# Altium footprint library PCB.PcbLib: 42 footprints (part 1 of 3)
Each footprint in its own frame and in the unit in brackets; x right, y up, seen from the top. Pads: shape width x height; smd on the part's side, far side on the other; paste and mask are expansions set on the pad; w line width, h text height; cw(c..) or ccw(c..) is an arc to the next point about the centre after c.
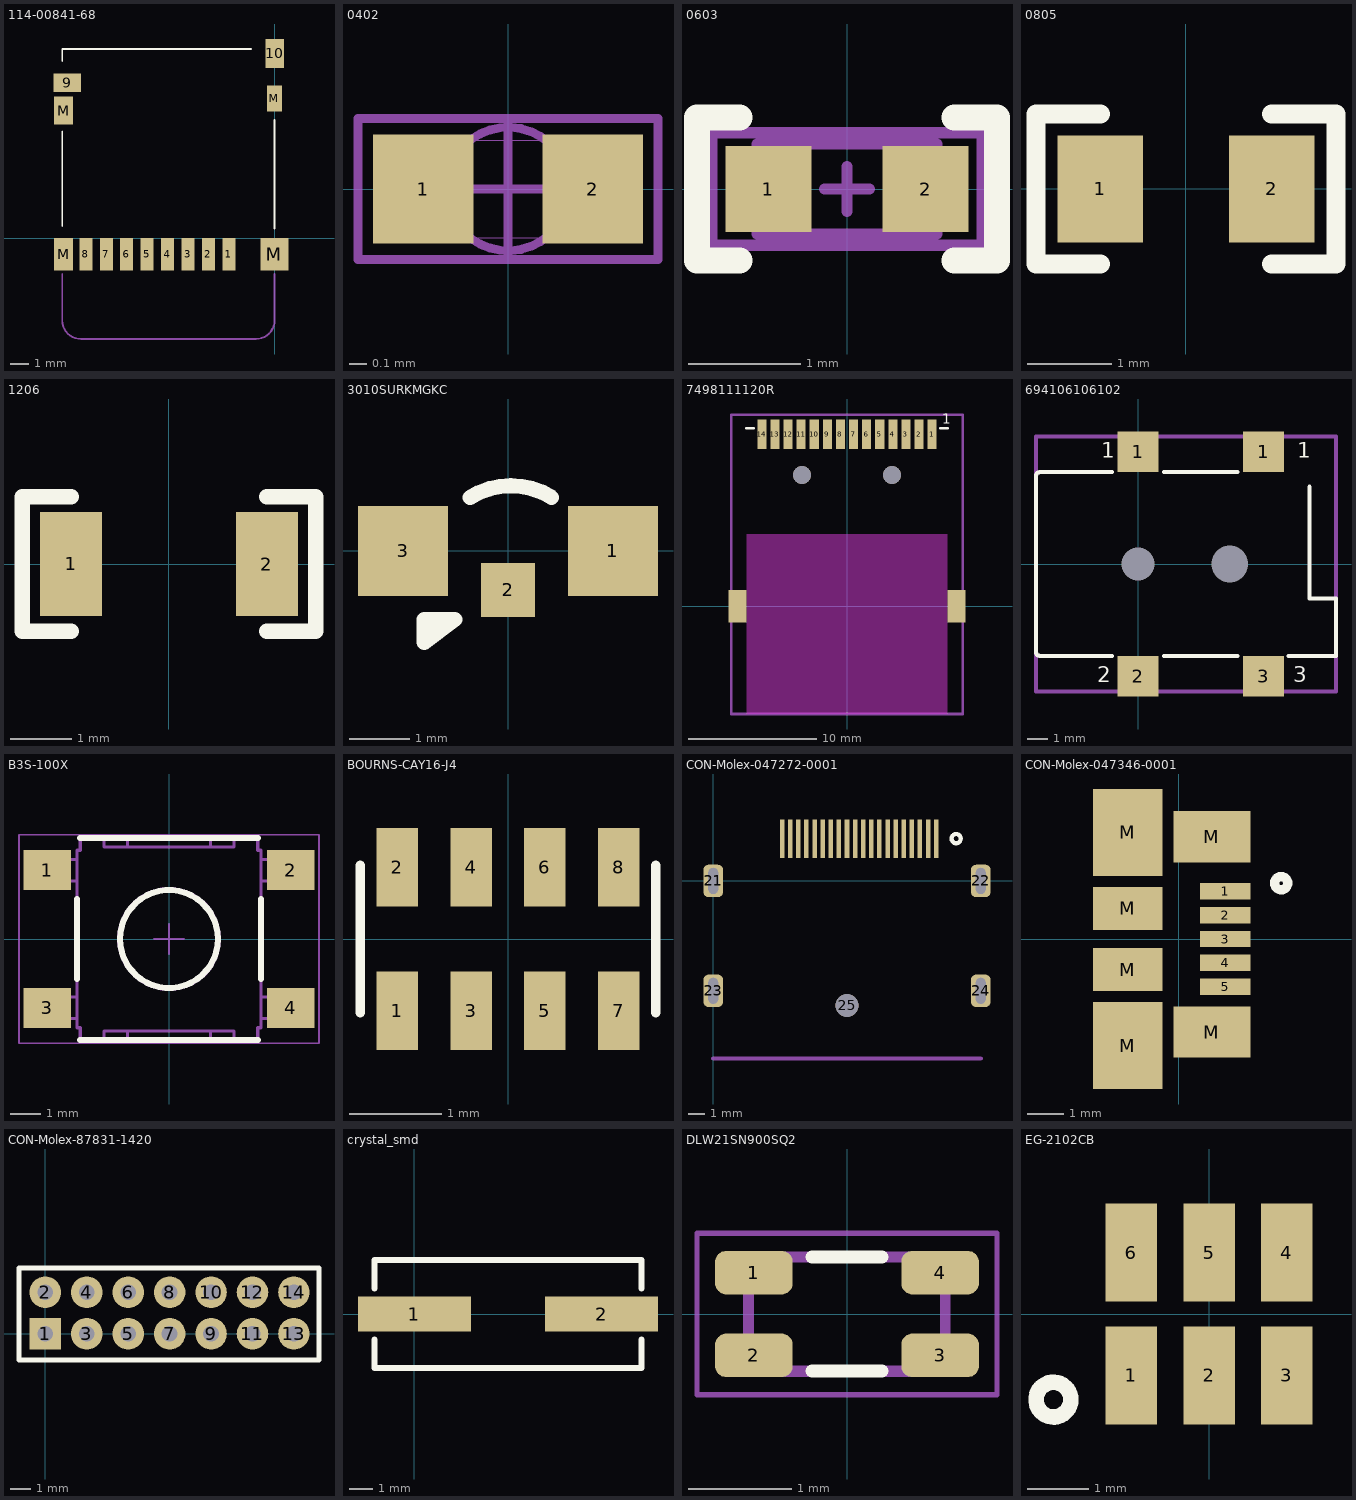
[diagram p0: the footprints below, top view; thin cyan lines are the x and y axes]

## 114-00841-68 [mm]
pads (14):
  rect 0.7x1.75 smd: 1(-2.455,-0.874) 2(-3.555,-0.874) 3(-4.655,-0.874) 4(-5.755,-0.874) 5(-6.855,-0.874) 6(-7.955,-0.874) 7(-9.055,-0.874) 8(-10.155,-0.874)
  rect 1.5x1 smd: 9(-11.155,8.365)
  rect 1x1.55 smd: 10(0.005,9.94)
  rect 1x1.75 smd: M(-11.355,-0.874)
  rect 1x1.5 smd: M(-11.355,6.865)
  rect 1.5x1.75 smd: M(-0.005,-0.874)
  rect 0.8x1.4 smd: M(-0.005,7.515)
Top Overlay:
  lines w0.1: -11.425,0.65 -11.425,5.73 ; -11.425,9.54 -11.425,10.175 -1.265,10.175 ; 0.005,0.523 0.005,6.365
Mechanical 15:
  lines w0.1: -11.425,-1.925 -11.425,-4.425 ccw(c-10.425,-4.425) -10.425,-5.425 -1,-5.425 ccw(c-1,-4.425) 0,-4.425 0,-1.925
  text "Micro SD Card" at -10.15,-4.075 h0.7
3D body: height 1.6, standoff 0, extent -11.628,-1.382 0.372,10.218

## 0402 [mm]
height 0.35
pads (2):
  rect 0.57x0.62 smd: 1(-0.48,0) 2(0.48,0)
Mechanical 13:
  lines w0.001: -0.525,-0.275 0.525,-0.275 0.525,0.275 -0.525,0.275 -0.525,-0.275
Mechanical 15:
  circle w0.05: c0,0 r0.35
  lines w0.05: -0.5,0 0.5,0 ; 0,-0.4 0,0.4 ; -0.85,-0.4 0.85,-0.4 0.85,0.4 -0.85,0.4 -0.85,-0.4
3D body: height 0.5, standoff 0, extent -0.55,-0.3 0.55,0.3

## 0603 [mil]
pads (2):
  rect 30x30 smd: 1(-27.5,0) 2(27.5,0)
Top Overlay:
  lines w9: -37.5,-25 -52.5,-25 -52.5,25 -37.5,25 ; 37.5,-25 52.5,-25 52.5,25 37.5,25
Mechanical 13:
  lines w3.94: -31.5,-15.75 -31.5,15.75 31.5,15.75 31.5,-15.75 -31.5,-15.75
Mechanical 15:
  lines w3.94: -7.87,0 7.87,0 ; 0,-7.87 0,7.87 ; -47.24,-19.68 -47.24,19.68 47.24,19.68 47.24,-19.68 -47.24,-19.68
3D body: height 30.75, standoff 0.75, extent -30,-14.99 30,15.01

## 0805 [mil]
pads (2):
  rect 40x50 smd: 1(-40,0) 2(40,0)
Top Overlay:
  lines w9: -40,-35 -70,-35 -70,35 -40,35 ; 40,-35 70,-35 70,35 40,35
3D body: height 24.11, standoff -0.49, extent -41.04,-25.09 37.83,25.1

## 1206 [mm]
pads (2):
  rect 1.016x1.7 smd: 1(-1.6,0) 2(1.6,0)
Top Overlay:
  lines w0.254: -1.6,-1.1 -2.4,-1.1 -2.4,1.1 -1.6,1.1 ; 1.6,-1.1 2.4,-1.1 2.4,1.1 1.6,1.1
3D body: height 0.95, standoff -0.01, extent -2.102,-0.893 2.098,0.907

## 3010SURKMGKC [mm]
pads (3):
  rect 1.5x1.5 smd: 1(1.75,0) 3(-1.75,0)
  rect 0.9x0.9 smd: 2(0,-0.65)
Top Overlay:
  lines w0.254: -0.635,0.889 cw(c0.049,-0.189) 0.727,0.892 ; -1.397,-1.524 -0.889,-1.143 -1.397,-1.143 -1.397,-1.524

## 7498111120R [mm] "WE-RJ45LAN 1000Base-T, SMT"
height 11.3
pads (18):
  rect 0.71x2.29 smd: 1(6.63,13.39) 2(5.61,13.39) 3(4.59,13.39) 4(3.57,13.39) 5(2.55,13.39) 6(1.53,13.39) 7(0.51,13.39) 8(-0.51,13.39) 9(-1.53,13.39) 10(-2.55,13.39) 11(-3.57,13.39) 12(-4.59,13.39) 13(-5.61,13.39) 14(-6.63,13.39)
  rect 1.4x2.54 smd: ""(-8.51,0) ""(8.51,0)
  round 1.4 hole 1.4 unplated paste+0: ""(-3.5,10.21) ""(3.5,10.21)
Top Overlay:
  lines w0.2: -7.825,13.84 -7.26,13.84 ; 7.26,13.84 7.825,13.84
  text "1" at 7.4,14.2 h0.76
Keep-Out Layer:
  board cut-out: -7.81,-8.37 7.81,-8.37 7.81,5.6 -7.81,5.6
Mechanical 13:
  lines w0.2: -9,-8.4 -9,14.9 9,14.9 9,-8.4 -9,-8.4
  text "PCB Cutout Area" at -5.2,-0.3 h0.76
3D body: height 10.1, standoff -3.2, extent -9.075,-8.02 9.075,14.46

## 694106106102 [mm] "WR-DC_DC Power Jack_Right Angled_SMT Center Pin ?2.0_Plug ID ?2.05_Plug OD ?5.5_with 4 Soldering Pag & Peg"
height 11
pads (6):
  rect 2x2 smd: 1(0,5.5) 1(6.15,5.5) 2(0,-5.5) 3(6.15,-5.5)
  round 1.4 hole 1.6 unplated: ""(0,0)
  round 1.6 hole 1.8 unplated: ""(4.5,0)
Top Overlay:
  lines w0.2: -5,-4.31 -5,4.31 ; -5,-4.3 ccw(c-4.812,-4.312) -4.8,-4.5 -1.27,-4.5 ; -5,4.3 cw(c-4.812,4.312) -4.8,4.5 -1.27,4.5 ; 1.27,-4.5 4.88,-4.5 ; 1.27,4.5 4.88,4.5 ; 7.366,-4.5 9.7,-4.5 9.7,-1.7 8.4,-1.7 8.4,3.785
  text "3" at 7.6,-5.8 h0.76
  text "2" at -2,-5.8 h0.76
  text "1" at 7.8,5.2 h0.76
  text "1" at -1.8,5.2 h0.76
Mechanical 13:
  lines w0.2: -5,-6.248 9.7,-6.248 9.7,6.252 -5,6.252 -5,-6.248
3D body: height 11.05, standoff -1.15, extent -5,-6.247 9.7,6.253

## B3S-100X [mm]
height 4.3
pads (4):
  rect 1.55x1.3 smd: 1(-3.975,2.25) 2(3.975,2.25) 3(-3.975,-2.25) 4(3.975,-2.25)
Top Overlay:
  circle w0.2: c0,0 r1.6
  lines w0.2: -3,-1.3 -3,1.3 ; -2.9,-3.3 2.9,-3.3 ; -2.9,3.3 2.9,3.3 ; 3,-1.3 3,1.3
Mechanical 13:
  circle w0.1: c0,0 r1.65
  lines w0.1: -3.5,-2.6 -3.5,-1.9 ; -3.5,1.9 -3.5,2.6 ; -3,-2.6 -4,-2.6 -4,-1.9 -3,-1.9 ; -3,1.9 -4,1.9 -4,2.6 -3,2.6 ; -2.125,-3.3 -2.125,-3 2.125,-3 2.125,-3.3 ; -2.125,3.3 -2.125,3 2.125,3 2.125,3.3 ; -1.35,-3 -1.35,-3.3 -2.9,-3.3 -2.9,-2.9 -3,-2.9 -3,2.9 -2.9,2.9 -2.9,3.3 -1.35,3.3 -1.35,3 ; 1.35,-3 1.35,-3.3 2.9,-3.3 2.9,-2.9 3,-2.9 3,2.9 2.9,2.9 2.9,3.3 1.35,3.3 1.35,3 ; 3,-2.6 4,-2.6 4,-1.9 3,-1.9 ; 3,1.9 4,1.9 4,2.6 3,2.6 ; 3.5,-2.6 3.5,-1.9 ; 3.5,1.9 3.5,2.6
Mechanical 15:
  lines w0.051: -0.5,0 0.5,0 ; 0,-0.5 0,0.5 ; -4.9,-3.4 -4.9,3.4 4.9,3.4 4.9,-3.4 -4.9,-3.4
3D body: height 4.4, standoff 0, extent -4.5,-3.3 4.5,3.3

## BOURNS-CAY16-J4 [mm]
pads (8):
  rect 0.45x0.85 smd: 1(-1.2,-0.775) 2(-1.2,0.775) 3(-0.4,-0.775) 4(-0.4,0.775) 5(0.4,-0.775) 6(0.4,0.775) 7(1.2,-0.775) 8(1.2,0.775)
Top Overlay:
  lines w0.1: -1.6,-0.8 -1.6,0.8 ; 1.6,-0.8 1.6,0.8
3D body: height 0.5, standoff 0, extent -1.6,-0.8 1.6,0.8

## CON-Molex-047272-0001 [mm]
pads (25):
  rect 0.28x2.4 smd: 1(13.75,2.6) 2(13.25,2.6) 3(12.75,2.6) 4(12.25,2.6) 5(11.75,2.6) 6(11.25,2.6) 7(10.75,2.6) 8(10.25,2.6) 9(9.75,2.6) 10(9.25,2.6) 11(8.75,2.6) 12(8.25,2.6) 13(7.75,2.6) 14(7.25,2.6) 15(6.75,2.6) 16(6.25,2.6) 17(5.75,2.6) 18(5.25,2.6) 19(4.75,2.6) 20(4.25,2.6)
  rrect50% 1.2x2 hole 0.6 slot 1.6 at 90 deg: 21(0,0) 22(16.5,0) 23(0,-6.78) 24(16.5,-6.78)
  round 1.4 hole 1.4 unplated: 25(8.25,-7.68)
Top Overlay:
  circle w0.254: c14.981,2.607 r0.284
Mechanical 1:
  lines w0.254: 0,-10.96 16.5,-10.96
3D body: height 6.66, standoff -2.09, extent -0.645,-12.064 17.14,2.829

## CON-Molex-047346-0001 [mm]
pads (11):
  rect 1.38x0.45 smd: 1(1.263,1.3) 2(1.263,0.65) 3(1.263,0) 4(1.263,-0.65) 5(1.263,-1.3)
  rect 1.9x2.37 smd: M(-1.397,-2.91) M(-1.397,2.91)
  rect 1.9x1.175 smd: M(-1.397,-0.837) M(-1.397,0.837)
  rect 2.1x1.4 smd: M(0.903,-2.54) M(0.903,2.794)
Top Overlay:
  circle w0.254: c2.794,1.524 r0.18
3D body: height 2.71, standoff -0.23, extent -3.796,-3.99 1.634,3.99

## CON-Molex-87831-1420 [mil]
pads (14):
  rect 60x60 hole 30: 1(0,0)
  round 60 hole 30: 2(0,78.74) 3(78.74,0) 4(78.74,78.74) 5(157.48,0) 6(157.48,78.74) 7(236.22,0) 8(236.22,78.74) 9(314.96,0) 10(314.96,78.74) 11(393.7,0) 12(393.7,78.74) 13(472.44,0) 14(472.44,78.74)
Top Overlay:
  lines w10: -50,-50 520.08,-50 520.08,125 -50,125 -50,-50
3D body: height 252.45, standoff -97.94, extent -88.76,-86.02 566.76,162.01

## crystal_smd [mil]
pads (2):
  rect 192.91x60 smd: 1(0,0) 2(320,0)
Top Overlay:
  lines w10: -68.35,-43.31 -68.35,-92.13 388.35,-92.13 388.35,-43.31 ; -68.35,43.31 -68.35,90 ; -68.35,92.13 388.35,92.13 ; 388.35,43.31 388.35,90
3D body: height 169.29, standoff 0, extent -90.54,-98.03 413.39,92.13

## DLW21SN900SQ2 [mm]
pads (4):
  rrect50% 0.75x0.42 smd: 1(-0.9,0.4) 2(-0.9,-0.4) 3(0.9,-0.4) 4(0.9,0.4)
Top Overlay:
  lines w0.127: -0.34,-0.55 0.34,-0.55 ; -0.34,0.55 0.34,0.55
Mechanical 2:
  lines w0.001: -1,-0.6 -1,0.6 1,0.6 1,-0.6 -1,-0.6
Mechanical 3:
  lines w0.05: -1.45,-0.78 -1.45,0.78 1.45,0.78 1.45,-0.78 -1.45,-0.78
  lines w0.1: -0.95,-0.55 -0.95,0.55 0.95,0.55 0.95,-0.55 -0.95,-0.55
3D body: height 1.2, standoff 0, extent -1,-0.6 1,0.6

## EG-2102CB [mm]
pads (6):
  rect 0.84x1.6 smd: 1(-1.27,-1) 2(0,-1) 3(1.27,-1) 4(1.27,1) 5(0,1) 6(-1.27,1)
Top Overlay:
  circle w0.254: c-2.54,-1.397 r0.284